# Altium integrated library CbyP.IntLib: 1144 symbols (part 2 of 6)
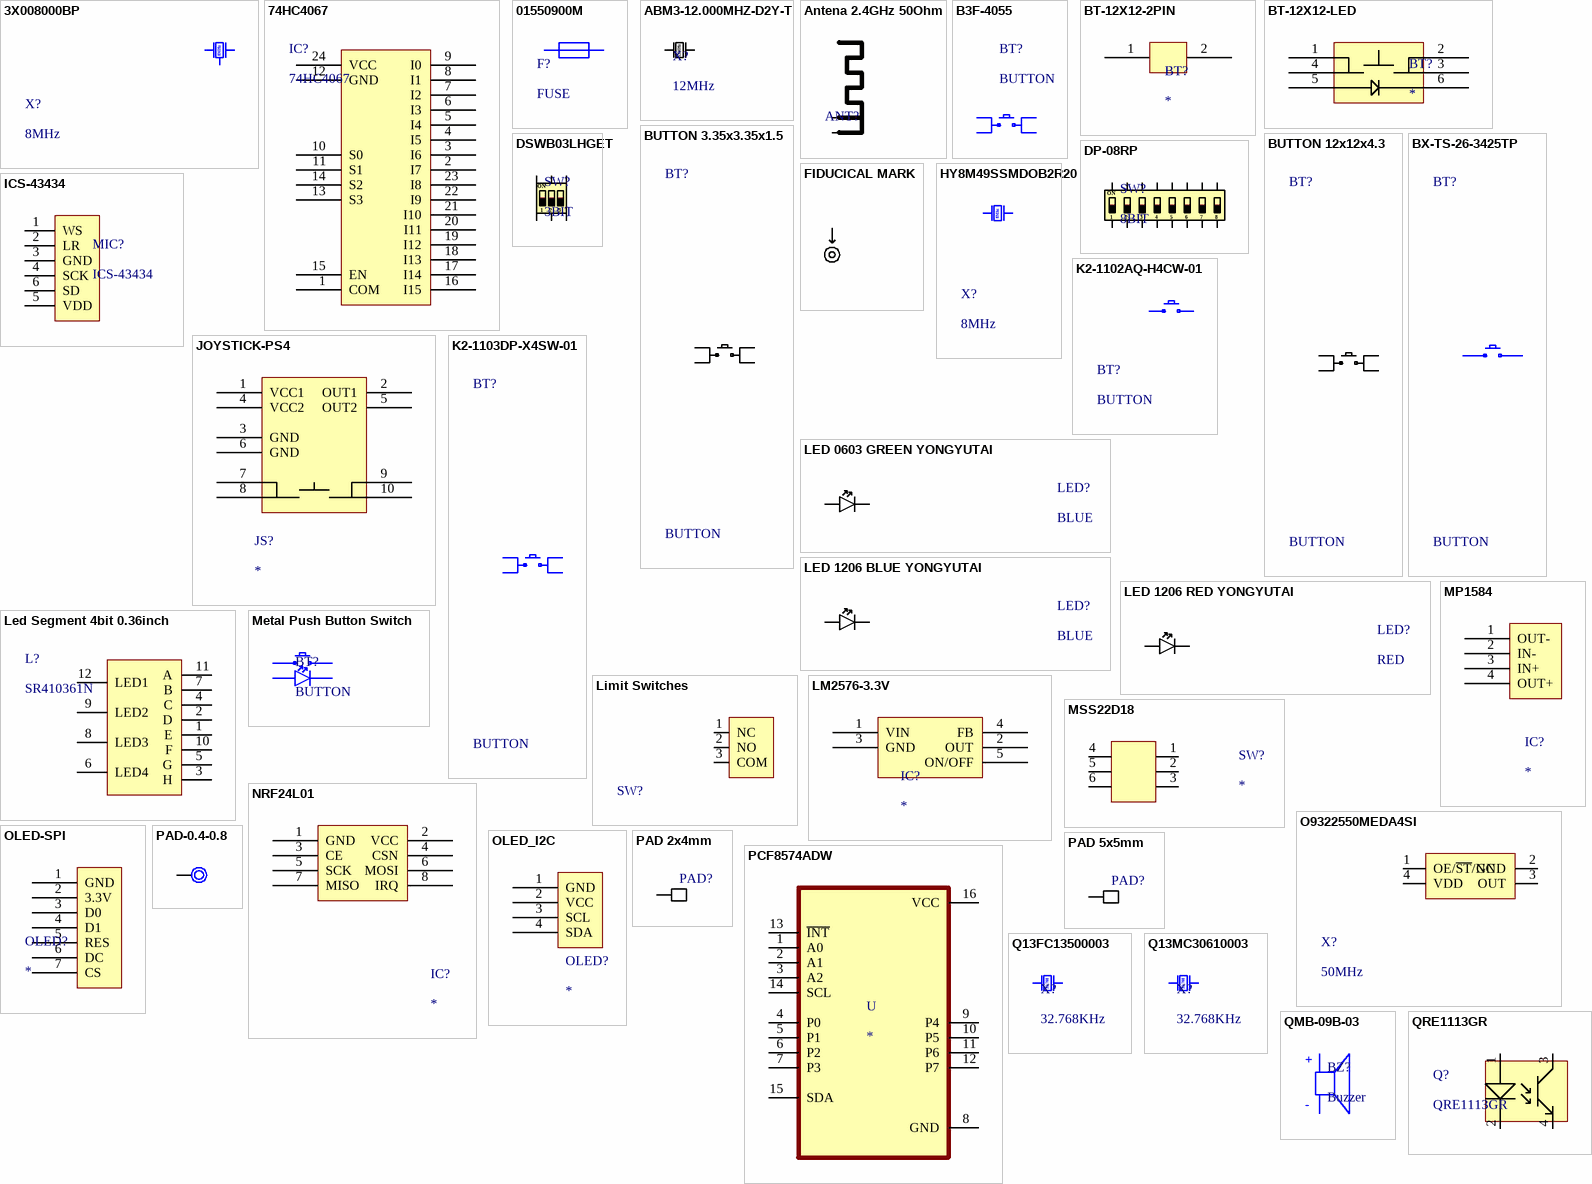
[diagram p42: symbols 3X008000BP to QRE1113GR]

## LED 1206 RED YONGYUTAI
designator LED?, comment RED
1206 LED Indication - Discrete ROHS; Manufacturer: YONGYUTAI; Mfr.Part #: YLED1206R; So_Chan_Cam: 0; So_Chan_Dan: 2; Name: LED 1206 RED YONGYUTAI; Package: 1206
footprint LED-RED-1206
pins: 1 A, 2 K

## Led Segment 4bit 0.36inch
designator L?, comment SR410361N
Red 4Bit Common anode 0.36 Plugin Led Segment Display ROHS
footprint LED_7_THANH_4_SO_0.36_INCH
pins: 1 E, 2 D, 3 H, 4 C, 5 G, 6 LED4, 7 B, 8 LED3, 9 LED2, 10 F, 11 A, 12 LED1

## Limit Switches
designator SW?  (value not drawn)
1A 30V Single Pole Double Throw (SPDT) Micro switch 1,000,000 Times Plugin Limit Switches ROHS; Manufacturer: XKB Connection; Mfr.Part #: DM1-150D-1; So_Chan_Dan: 0; So_Chan_Cam: 3; Package: Plugin; Name: Limit Switches
footprint Plugin, P=5.08
pins: 1 NC, 2 NO, 3 COM

## LM2576-3.3V
designator IC?
footprint TO220-5PIN
pins: 1 VIN, 2 OUT, 3 GND, 4 FB, 5 ON/OFF

## Metal Push Button Switch
designator BT?, comment BUTTON
ComponentLink1Description: Link
footprint Metal Push Button Switch
pins: 1, 2, 3, 4

## MP1584
designator IC?
footprint MP1584
pins: 1 OUT-, 2 IN-, 3 IN+, 4 OUT+

## MSS22D18
designator SW?
SMD
footprint MSS22D18 SMD
pins: 1 77, 2 78, 3 79, 4, 5 81, 6 82

## NRF24L01
designator IC?
footprint NRF24L01
pins: 1 GND, 2 VCC, 3 CE, 4 CSN, 5 SCK, 6 MOSI, 7 MISO, 8 IRQ

## O9322550MEDA4SI
designator X?, comment 50MHz
3.3V CMOS ±30ppm 50MHz SMD3225-4P Oscillators RoHS; Manufacturer: YXC Crystal Oscillators; Mfr.Part #: O9322550MEDA4SI; Package: SMD3225-4P; LCSC Part #: C496690; DigiKey Part Number: NO
footprint SMD3225-4P
pins: 1 OE/~{ST}/NC, 2 GND, 3 OUT, 4 VDD

## OLED-SPI
designator OLED?
footprint OLED-SPI-2
pins: 1 GND, 2 3.3V, 3 D0, 4 D1, 5 RES, 6 DC, 7 CS

## OLED_I2C
designator OLED?
0.96
footprint OLED_I2C_0.96
pins: 1 GND, 2 VCC, 3 SCL, 4 SDA

## PAD 2x4mm
designator PAD?  (value not drawn)
footprint PAD, 2x4mm
pins: 1

## PAD 5x5mm
designator PAD?, comment PAD 2x4mm  (value not drawn)
footprint PAD, 2x4mm
pins: 1

## PAD-0.4-0.8
designator ?
footprint PAD,0.4,0.8
pins: 0

## PCF8574ADW
designator U
Remote 8-Bit I/O Expander for I2C-Bus 16-SOIC -40 to 85; MF: Texas Instruments; MP: PCF8574ADW; Mouser-Purchase-URL: https://snapeda.com/shop?store=Mouser&id=554599; SnapEDA_Link: https://www.snapeda.com/parts/PCF8574ADW/Texas%20Instruments/view-part/554599/?ref=snap; DigiKey-Purchase-URL: https://snapeda.com/shop?store=DigiKey&id=554599; Package: SOIC-16 Texas Instruments; Price: None; Availability: Warning; Texas_Instruments-Purchase-URL: https://snapeda.com/shop?store=Texas+Instruments&id=554599; Value: *
footprint SO16W
pins: 1 A0, 2 A1, 3 A2, 4 P0, 5 P1, 6 P2, 7 P3, 8 GND (power), 9 P4, 10 P5, 11 P6, 12 P7, 13 ~{INT}, 14 SCL, 15 SDA, 16 VCC (power)

## Q13FC13500003
designator X?, comment 32.768KHz
CRYSTAL 32.768kHz 9pF SMD; Manufacturer: EPSON; Mfr.Part #: Q13FC13500003; Package: SMD3215; LCSC Part #: C99010
footprint SMD3215
pins: 1, 2
text: 32.768

## Q13MC30610003
designator X?, comment 32.768KHz
Crystal 32.768kHz ±20ppm 12.5pF 35kΩ MC-306; Manufacturer: EPSON; Mfr.Part #: Q13MC30610003; Package: MC-306; LCSC Part #: C16320; DigiKey Part Number: SER2407TR-ND
footprint MC-306
pins: 1, 4
text: 32.768

## QMB-09B-03
designator BZ?, comment Buzzer
Buzzers Passive (Externally Driven) Magnetic 2V~5V 2.7kHz 85dB Through Hole,D=9mm; Manufacturer: Huaneng; Mfr.Part #: QMB-09B-03; Package: Through Hole,D=9mm; LCSC Part #: C96256
footprint Plugin,D=9mm
pins: 1, 2
text: +; -

## QRE1113GR
designator Q?
20mA 1mm SMD-4P Reflective Optical Interrupters ROHS; Manufacturer: onsemi; So_Chan_Dan: 4; So_Chan_Cam: 0; Mfr.Part #: QRE1113GR; Package: SMD-4P; Name: QRE1113GR
footprint SMD-4P
pins: 1, 2, 3, 4

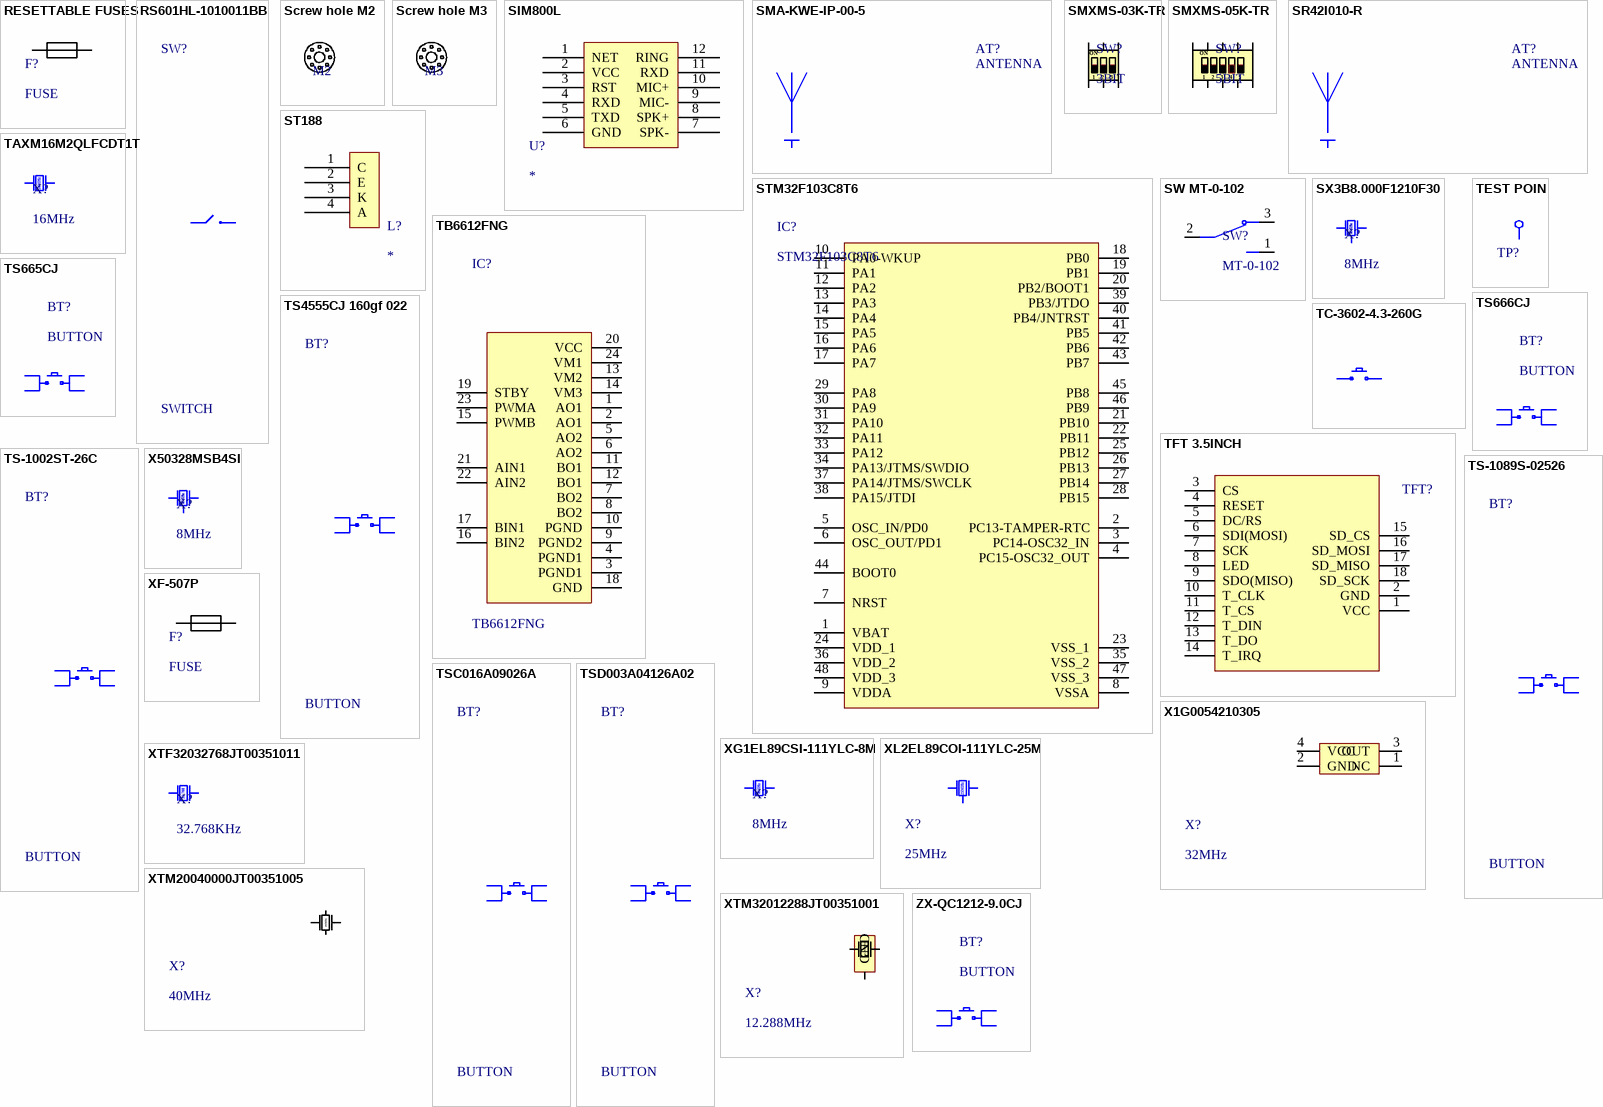
[diagram p6: symbols RESETTABLE FUSES to ZX-QC1212-9.0CJ]

## RESETTABLE FUSES
designator F?, comment FUSE
60V 500mA 40A 1A Plugin Resettable Fuses ROHS; Manufacturer: RUILON(Shenzhen Ruilongyuan Elec); Mfr.Part #: RL60-050; So_Chan_Dan: 0; So_Chan_Cam: 2; Package: Plugin; Name: RESETTABLE FUSES
footprint Plugin
pins: 1, 2

## RS601HL-1010011BB
designator SW?, comment SWITCH
SPST 10,000 times 3A Solder 250V None Plugin Rocker Switches ROHS; Manufacturer: HCTL; Mfr.Part #: RS601HL-1010011BB; Package: Through Hole,15x10.5mm; LCSC Part #: C2885782; DigiKey Part Number: NO
footprint Plugin,Rocker Switches
pins: 1, 2

## Screw hole M2
designator S?, comment M2
footprint Screw hole M2

## Screw hole M3
designator ?, comment M3
footprint Screw hole M3

## SIM800L
designator U?
footprint SIM800L
pins: 1 NET "50", 2 VCC, 3 RST, 4 RXD, 5 TXD, 6 GND, 7 SPK-, 8 SPK+, 9 MIC-, 10 MIC+, 11 RXD, 12 RING "50"

## SMA-KWE-IP-00-5
designator AT?, comment ANTENNA
SMA to IPEX Gen 1 Coaxial Cables (RF) Assemblies RoHS; Manufacturer: SAMZO; Mfr.Part #: SMA-KWE-IP-00-5; Package: Through Hole, Right Angle; LCSC Part #: C47121936; DigiKey Part Number: NO; ComponentLink1Description: Link; ComponentLink1URL: https://www.lcsc.com/product-detail/C47121936.html; ComponentLink2Description: Link 1
footprint ANTENNA, Through Hole, Right Angle
pins: 1 GND

## SMXMS-03K-TR
designator SW?, comment 3BIT
3 24V Black 25mA SMD-6P,5.4x5.4mm DIP Switches ROHS; Manufacturer: SM Switch; Mfr.Part #: SMXMS-03K-TR; Package: SMD-6P,5.4x5.4mm; LCSC Part #: C19272175
footprint SMD-6P,5.4x5.4mm
pins: 1, 2, 3, 4, 5, 6
text: ON

## SMXMS-05K-TR
designator SW?, comment 5BIT
5 Digits 24V Black 25mA SMD-10P,7.9x5.4mm DIP Switches ROHS; Manufacturer: SM Switch; Mfr.Part #: SMXMS-05K-TR; So_Chan_Dan: 5; So_Chan_Cam: 0; Package: SMD-10P,7.9x5.4mm; Name: SMXMS-05K-TR
footprint SMD-10P,7.9x5.4mm
pins: 1, 2, 3, 4, 5, 6, 7, 8, 9, 10
text: ON

## SR42I010-R
designator AT?, comment ANTENNA
Patch Antenna SMD-9P,12x11mm RF Antennas RoHS; Manufacturer: Antenova; Mfr.Part #: SR42I010-R; Package: SMD-9P,12x11mm; LCSC Part #: C3285093; DigiKey Part Number: 627-SR42I010-RTR-ND; ComponentLink1Description: Link; ComponentLink1URL: https://www.lcsc.com/product-detail/C3285093.html?s_z=n_q_C3285093&globalKeyword=C3285093; ComponentLink2Description: Link 1; ComponentLink2URL: https://www.digikey.com/en/products/detail/antenova/SR42I010-R/13980932?s=N4IgTCBcDaIMoCUAsYCSAGAjOgtAkAugL5A
footprint SR42I010-R
pins: 1 B.Sel, 2 Feed

## ST188
designator L?
footprint ST188
pins: 1 C, 2 E, 3 K, 4 A

## STM32F103C8T6
designator IC?
ARM Cortex-M3 32 Bit 72MHz 37 LQFP-48(7x7) Microcontrollers RoHS; Manufacturer: ST; Mfr.Part #: STM32F103C8T6; Package: LQFP-48(7x7); LCSC Part #: C8734; DigiKey Part Number: 497-6063-ND; ComponentLink1Description: Link; ComponentLink1URL: https://www.lcsc.com/product-detail/C8734.html?s_z=n_STM32F103C8T6; ComponentLink2Description: Link 1; ComponentLink2URL: https://www.digikey.com/en/products/detail/stmicroelectronics/STM32F103C8T6/1646338
footprint LQFP-48(7x7)
pins: 1 VBAT, 2 PC13-TAMPER-RTC, 3 PC14-OSC32_IN, 4 PC15-OSC32_OUT, 5 OSC_IN/PD0, 6 OSC_OUT/PD1, 7 NRST, 8 VSSA, 9 VDDA, 10 PA0-WKUP, 11 PA1, 12 PA2, 13 PA3, 14 PA4, 15 PA5, 16 PA6, 17 PA7, 18 PB0, 19 PB1, 20 PB2/BOOT1, 21 PB10, 22 PB11, 23 VSS_1, 24 VDD_1, 25 PB12, 26 PB13, 27 PB14, 28 PB15, 29 PA8, 30 PA9, 31 PA10, 32 PA11, 33 PA12, 34 PA13/JTMS/SWDIO, 35 VSS_2, 36 VDD_2, 37 PA14/JTMS/SWCLK, 38 PA15/JTDI, 39 PB3/JTDO, 40 PB4/JNTRST, 41 PB5, 42 PB6, 43 PB7, 44 BOOT0, 45 PB8, 46 PB9, 47 VSS_3, 48 VDD_3

## SW MT-0-102
designator SW?, comment MT-0-102
125V SPDT Straight 5A Plugin Toggle Switches ROHS; Manufacturer: YUEN FUNG; Mfr.Part #: MT-0-102-A101-M200-RS; Name: SW MT-0-102; So_Chan_Cam: 3; So_Chan_Dan: 0; Package: Plugin
footprint SW, Plugin,3P
pins: 1, 2, 3

## SX3B8.000F1210F30
designator X?, comment 8MHz
8MHz Crystal Oscillator 12pF ±10ppm ±30ppm SMD3225-4P Crystals ROHS; Manufacturer: Shenzhen SCTF Elec; Mfr.Part #: SX3B8.000F1210F30; Package: SMD3225-4P; LCSC Part #: C2901645
footprint SMD3225-4P
pins: 1, 2 GND, 3, 4 GND

## TAXM16M2QLFCDT1T
designator X?, comment 16MHz
Crystal Oscillator 20pF SMD5032-2P Crystals RoHS; Manufacturer: Yajingxin; Mfr.Part #: TAXM16M2QLFCDT1T; Package: SMD5032-2P; LCSC Part #: C122519; DigiKey Part Number: NO
footprint SMD5032
pins: 1, 2

## TB6612FNG
designator IC?
1A Brush DC Motor 2.7V~5.5V Parallel SSOP-24 Motor Driver ICs ROHS; Manufacturer: TOSHIBA; Mfr.Part #: TB6612FNG,C,8,EL; Package: SSOP-24; LCSC Part #: C141517; DigiKey Part Number: TB6612FNGC8ELTR-ND
footprint SSOP-24
pins: 1 AO1, 2 AO1, 3 PGND1, 4 PGND1, 5 AO2, 6 AO2, 7 BO2, 8 BO2, 9 PGND2, 10 PGND, 11 BO1, 12 BO1, 13 VM2 (power), 14 VM3 (power), 15 PWMB, 16 BIN2, 17 BIN1, 18 GND, 19 STBY, 20 VCC (power), 21 AIN1, 22 AIN2, 23 PWMA, 24 VM1 (power)

## TC-3602-4.3-260G
designator BT?, comment BUTTON
SWITCH TACTILE SPST 260gf SMD; Manufacturer: HCTL; Mfr.Part #: TC-3602-4.3-260G; Package: SMD,6x3.5mm; LCSC Part #: C3012022
footprint BUTTON-6X3.5x4.3-2PIN
pins: 1, 2

## TEST POIN
designator TP?, comment TP  (value not drawn)
Test poin; Manufacturer: NO; Mfr.Part #: NO; Package: SMD,D=1mm; LCSC Part #: NO; DigiKey Part Number: NO
footprint TEST POIN D=12=mm
pins: 1

## TFT 3.5INCH
designator TFT?, comment RED  (value not drawn)
TFT 3.5INCH; So_Chan_Cam: 18; So_Chan_Dan: 0; Manufacturer: TFT 3.5INCH; Mfr.Part #: TFT 3.5INCH; Package: TFT 3.5INCH; Name: TFT 3.5INCH
footprint TFT 3.5INCH 1
pins: 1 VCC, 2 GND, 3 CS, 4 RESET, 5 DC/RS, 6 SDI(MOSI), 7 SCK, 8 LED, 9 SDO(MISO), 10 T_CLK, 11 T_CS, 12 T_DIN, 13 T_DO, 14 T_IRQ, 15 SD_CS, 16 SD_MOSI, 17 SD_MISO, 18 SD_SCK

## TS665CJ
designator BT?, comment BUTTON
Tactile Switch SPST 5mm 6mm x 6mm Through Hole; Manufacturer: SHOU HAN; Mfr.Part #: TS665CJ; LCSC Part #: C393938; Package: Through Hole-4P,6x6mm; DigiKey Part Number: NO; ComponentLink1Description: Link; ComponentLink1URL: https://www.lcsc.com/product-detail/C393938.html
footprint Through Hole-4P,6x6x5mm
pins: 1, 2, 3, 4

## TS666CJ
designator BT?, comment BUTTON
Tactile Switch SPST 250gf 6mm PC Pin 6mm x 6mm Through Hole; Manufacturer: SHOU HAN; Mfr.Part #: TS666CJ; LCSC Part #: C557621; Package: Through Hole-4P,6x6mm; DigiKey Part Number: NO; ComponentLink1Description: Link; ComponentLink1URL: https://www.lcsc.com/product-detail/C557621.html
footprint Through Hole-4P,6x6x6mm
pins: 1, 2, 3, 4

## TS4555CJ 160gf 022
designator BT?, comment BUTTON
Without Bracket 12V Round Button No SPST 50mA Through Hole-4P,4.5x4.5mm Tactile Switches ROHS; Manufacturer: SHOU HAN; Mfr.Part #: TS4555CJ 160gf 022; Package: Through Hole-4P,4.5x4.5mm; LCSC Part #: C5369124; DigiKey Part Number: NO
footprint Plugin, Button 4.5x4.5mm
pins: 1, 2, 3, 4

## TS-1002ST-26C
designator BT?, comment BUTTON
Tactile Switch SPST 7.3mm 6mm x 6mm Surface Mount; Manufacturer: XUNPU; Mfr.Part #: TS-1002ST-26C; Package: SMD-4P,6x6mm; LCSC Part #: C455199; DigiKey Part Number: NO
footprint BUTTON-6x6x7.3-4PIN-SQUARE
pins: 1, 2, 3, 4

## TS-1089S-02526
designator BT?, comment BUTTON
3.25mm 2.5mm Oval button 50mA Standing paste 4.2mm SPST 12V SMD,3.3x4.2mm Tactile Switches ROHS; Manufacturer: XUNPU; Mfr.Part #: TS-1089S-02526; Package: SMD,3.3x4.2mm; LCSC Part #: C455282; DigiKey Part Number: NO
footprint SMD,3.3x4.2mm
pins: 1, 2, 3, 4

## TSC016A09026A
designator BT?, comment BUTTON
4.5mm 9mm 50mA Round Button Straight 4.5mm 2.6N 12V Plugin Tactile Switches ROHS; Manufacturer: BZCN; Mfr.Part #: TSC016A09026A; Package: Through Hole-4P,4.5x4.5mm; LCSC Part #: C2888899
footprint Plugin, Button 4.5x4.5mm
pins: 1, 2, 3, 4

## TSD003A04126A02
designator BT?, comment BUTTON
Tactile Switch 260gf 4.1mm 6mm x 6mm Surface Mount; Manufacturer: BZCN; Mfr.Part #: TSD003A04126A02; Package: SMD-4P,6x6mm; ComponentLink1Description: Link; ComponentLink1URL: https://www.lcsc.com/product-detail/C2888573.html?s_z=n_TSD003A04126A02&spm=wm.ssy.bg.0.xh&lcsc_vid=QVhYA1deElkMBVEAQVVWVAECEVVXUAcCTgNYUQVSEVAxVlNRQVBcXlxUT1NdUjsOAxUeFF5JWBYZEEoKFBINSQcJGk4eFQsCAgIaSgADAwAHC0slRlleUFNRQlhADxALGw%3D%3D; ComponentLink2Description: Link 1; LCSC Part #: C2888573; DigiKey Part Number: NO
footprint BUTTON-6x6x4.1-4PIN
pins: 1, 2, 3, 4

## X1G0054210305
designator X?, comment 32MHz
Temperature Compensated Crystal Oscillator (TCXO); Manufacturer: EPSON; Mfr.Part #: X1G0054210305; Package: SMD2520-4P; LCSC Part #: C3007516
footprint SMD2520-4P
pins: 1 NC, 2 GND, 3 OUT, 4 VCC

## X50328MSB4SI
designator X?, comment 8MHz
Crystal 8MHz ±10ppm 20pF SMD5032-4P; Manufacturer: YXC Crystal Oscillators; Mfr.Part #: X50328MSB4SI; Package: SMD5032-4P; LCSC Part #: C157341; DigiKey Part Number: NO; ComponentLink1Description: Link; ComponentLink1URL: https://www.lcsc.com/product-detail/C157341.html?s_z=n_c157341; ComponentLink2Description: Link 1
footprint SMD5032-4P
pins: 1, 2 GND, 3, 4 GND

## XF-507P
designator F?, comment FUSE
Fuseholders ROHS; Manufacturer: XFCN; Mfr.Part #: XF-507P; Package: Plugin
footprint XF-507P
pins: 1, 2

## XG1EL89CSI-111YLC-8M
designator X?, comment 8MHz
Crystal 8MHz ±10ppm 20pF SMD5032-2P; Manufacturer: YXC Crystal Oscillators; Mfr.Part #: XG1EL89CSI-111YLC-8M; Package: SMD5032-2P; LCSC Part #: C5280575; DigiKey Part Number: NO; ComponentLink1Description: Link; ComponentLink1URL: https://www.lcsc.com/product-detail/C5280575.html
footprint SMD5032
pins: 1, 2

## XL2EL89COI-111YLC-25M
designator X?, comment 25MHz
Crystal 25MHz ±10ppm 12pF SMD3225-4P; Manufacturer: YXC Crystal Oscillators; Mfr.Part #: XL2EL89COI-111YLC-25M; Package: SMD3225-4P; LCSC Part #: C5444544; DigiKey Part Number: NO
footprint SMD3225-4P
pins: 1, 2 GND, 3, 4 GND

## XTF32032768JT00351011
designator X?, comment 32.768KHz
Crystal Oscillator 12pF SMD3215-2P Crystals RoHS; Manufacturer: TOGNJING; Mfr.Part #: XTF32032768JT00351011; Package: SMD3215; LCSC Part #: C37635363; DigiKey Part Number: NO
footprint SMD3215
pins: 1, 2
text: 32.768

## XTM20040000JT00351005
designator X?, comment 40MHz
40MHz Surface Mount Crystal 12pF ±10ppm ±20ppm SMD2016-4P Crystals ROHS; Manufacturer: TOGNJING; Mfr.Part #: XTM20040000JT00351005; So_Chan_Dan: 4; So_Chan_Cam: 0; Package: SMD2016-4P; Name: XTM20040000JT00351005
footprint SMD2016-4P
pins: 1, 2 GND, 3, 4 GND

## XTM32012288JT00351001
designator X?, comment 12.288MHz
12.288MHz Crystal Oscillator 12pF ±10ppm ±10ppm SMD3225-4P Crystals ROHS; Manufacturer: TOGNJING; Mfr.Part #: XTM32012288JT00351001; Package: SMD3225-4P; LCSC Part #: C41383238; ComponentLink1Description: Link; ComponentLink1URL: https://www.lcsc.com/product-detail/C41383238.html?s_z=n_XTM32012288JT00351001; ComponentLink2Description: Link 1; DigiKey Part Number: NO
footprint SMD3225-4P
pins: 1, 2 GND, 3, 4 GND

## ZX-QC1212-9.0CJ
designator BT?, comment BUTTON
Without Bracket 12mm 12V 12mm Round Button SPST 50mA Through Hole,12x12mm Tactile Switches RoHS; Manufacturer: Megastar; Mfr.Part #: ZX-QC1212-9.0CJ; LCSC Part #: C7470193; Package: Through Hole,12x12mm; DigiKey Part Number: NO
footprint BUTTON-12x12x9mm
pins: 1, 2, 3, 4


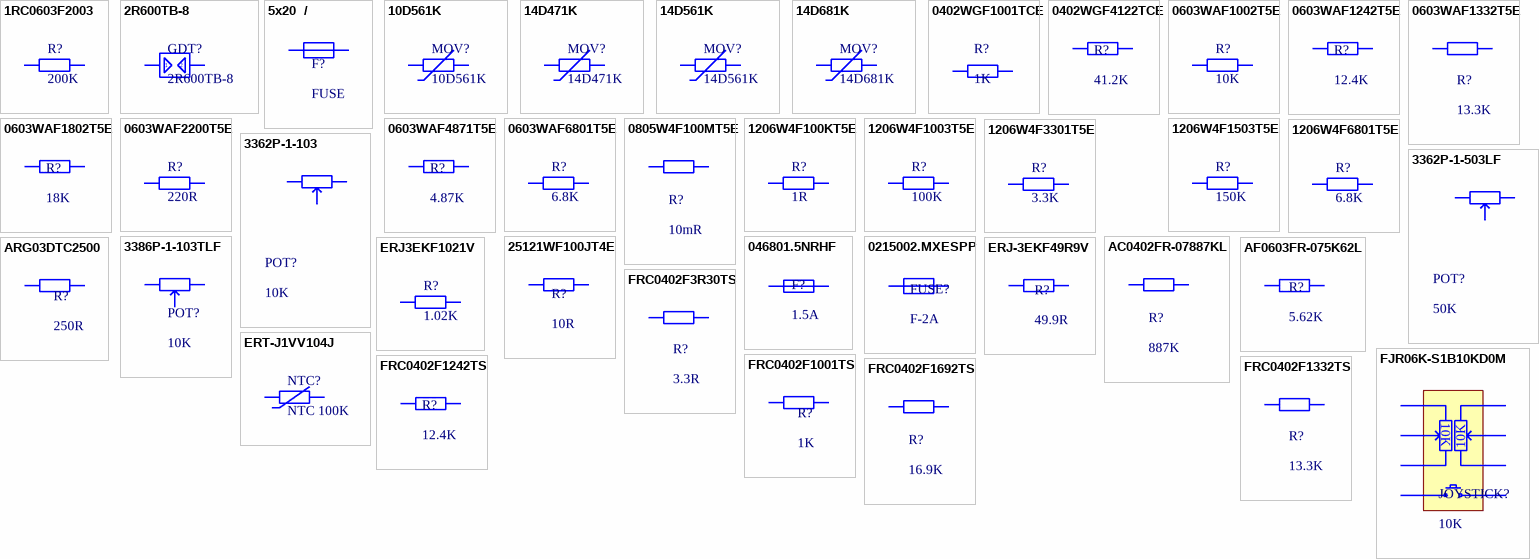
[diagram p7: symbols 1RC0603F2003 to FRC0402F1692TS]

## 1RC0603F2003
designator R?, comment 200K
100mW 200kΩ 75V Thick Film Resistor ±100ppm/℃ ±1% 0603 Chip Resistor - Surface Mount RoHS; Manufacturer: SAE; Mfr.Part #: 1RC0603F2003; Package: 0603; LCSC Part #: C53224194
footprint RES-0603
pins: 1, 2

## 2R600TB-8
designator GDT?
GDT 600V 10kA 2 POLE TH; Manufacturer: RUILON; Mfr.Part #: 2R600TB-8; Package: Through Hole,D8xL6mm; LCSC Part #: C2686911
footprint Through Hole,P=12.5mm,8x6x8mm
pins: 1, 2

## 5x20  /
designator F?, comment FUSE
Cylindrical Clip Through Hole,P=4.8mm Fuseholders RoHS; Manufacturer: Xucheng Elec; Mfr.Part #: 5x20  /; Package: Through Hole,P=4.8mm; LCSC Part #: C3130; DigiKey Part Number: NO; ComponentLink1Description: Link; ComponentLink1URL: https://www.lcsc.com/product-detail/C3130.html
footprint Through Hole,P=4.8mm
pins: 1, 2

## 10D561K
designator MOV?
920V 460V 350V 504V~616V Through Hole,P=7.5mm Varistors, MOVs RoHS; Manufacturer: RUILON; Mfr.Part #: 10D561K; Package: Through Hole,P=7.5mm; LCSC Part #: C233178; DigiKey Part Number: 5789-10D561K-ND
footprint Through Hole,P=7.5mm
pins: 1, 2

## 14D471K
designator MOV?
VARISTOR 470V 4500A P=7.5mm; Manufacturer: R+O; Mfr.Part #: 14D471K; Package: Through Hole,P=7.5mm; LCSC Part #: C49069733
footprint Through Hole,P=7.5mm,14x6x14mm
pins: 1, 2

## 14D561K
designator MOV?
925V 460V 350V 504V~616V Through Hole,P=7.5mm Varistors, MOVs RoHS; Manufacturer: R+O; Mfr.Part #: 14D561K; Package: Through Hole,P=7.5mm; LCSC Part #: C49069734
footprint Through Hole,P=7.5mm,14x6x14mm
pins: 1, 2

## 14D681K
designator MOV?
1.12kV 560V 420V 612V~748V Through Hole,P=7.5mm Varistors, MOVs RoHS; Manufacturer: R+O; Mfr.Part #: 14D681K; Package: Through Hole,P=7.5mm; LCSC Part #: C49069736
footprint Through Hole,P=7.5mm,14x6x14mm
pins: 1, 2

## 0402WGF1001TCE
designator R?, comment 1K
62.5mW Thick Film Resistor 50V ±100ppm/℃ ±1% 1kΩ 0402 Chip Resistor - Surface Mount ROHS; Manufacturer: UNI-ROYAL(Uniroyal Elec); Mfr.Part #: 0402WGF1001TCE; Package: 0402; LCSC Part #: C11702; DigiKey Part Number: NO
footprint RES-0402
pins: 1, 2

## 0402WGF4122TCE
designator R?, comment 41.2K
41.2kΩ ±1% 62.5mW 0402 Thick Film Resistor; Manufacturer: UNI-ROYAL; Mfr.Part #: 0402WGF4122TCE; Package: 0402; LCSC Part #: C26978; DigiKey Part Number: NO; ComponentLink1Description: Link; ComponentLink1URL: https://www.lcsc.com/product-detail/C26978.html; ComponentLink2Description: Link 1
footprint RES-0402
pins: 1, 2

## 0603WAF1002T5E
designator R?, comment 10K
10kΩ ±1% 100mW 0603 Thick Film Resistor; Manufacturer: UNI-ROYAL; Mfr.Part #: 0603WAF1002T5E; Package: 0603; LCSC Part #: C25804; DigiKey Part Number: NO; ComponentLink1Description: Link; ComponentLink1URL: https://www.lcsc.com/product-detail/C25804.html?s_z=n_0603WAF1002T5E; ComponentLink2Description: Link 1
footprint RES-0603
pins: 1, 2

## 0603WAF1242T5E
designator R?, comment 12.4K
12.4kΩ ±1% 100mW 0603 Thick Film Resistor; Manufacturer: UNI-ROYAL; Mfr.Part #: 0603WAF1242T5E; Package: 0603; LCSC Part #: C22865; DigiKey Part Number: NO; ComponentLink1Description: Link; ComponentLink1URL: https://www.lcsc.com/product-detail/C22865.html?s_z=n_q_t_12.4K&spm=wm.fly.bg.7.xh___wm.ssy.tc.0.tz&lcsc_vid=QwdcUVxUFAdbVwUFRQBWBVECTlNYX1QAQFddU1EFQ1kxVlNRT1RXUFZXT1BdXzsOAxUeFF5JWBYZEEoKFBINSQcJGk4eFQsCAgIaSgADAwAHC0slRlleUFNRQlhADxALGw%3D%3D; ComponentLink2Description: Link 1
footprint RES-0603
pins: 1, 2

## 0603WAF1332T5E
designator R?, comment 13.3K
100mW 13.3kΩ 75V ±100ppm/℃ Thick Film Resistor ±1% 0603 Chip Resistor - Surface Mount ROHS; Manufacturer: UNI-ROYAL; Mfr.Part #: 0603WAF1332T5E; Package: 0603; LCSC Part #: C25952
footprint RES-0603
pins: 1, 2

## 0603WAF1802T5E
designator R?, comment 18K
18kΩ ±1% 100mW 0603 Thick Film Resistor; Manufacturer: UNI-ROYAL; Mfr.Part #: 0603WAF1802T5E; Package: 0603; LCSC Part #: C25810; DigiKey Part Number: NO; ComponentLink1Description: Link; ComponentLink1URL: https://www.lcsc.com/product-detail/C25810.html?s_z=n_18K; ComponentLink2Description: Link 1
footprint RES-0603
footprint RES-0603-1
pins: 1, 2

## 0603WAF2200T5E
designator R?, comment 220R
220Ω ±1% 100mW 0603 Thick Film Resistor; Manufacturer: UNI-ROYAL; Mfr.Part #: 0603WAF2200T5E; Package: 0603; LCSC Part #: C22962; DigiKey Part Number: NO; ComponentLink1Description: Link; ComponentLink1URL: https://www.lcsc.com/product-detail/C22962.html?s_z=n_0603waf22; ComponentLink2Description: Link 1
footprint RES-0603
pins: 1, 2

## 0603WAF4871T5E
designator R?, comment 4.87K
4.87kΩ ±1% 100mW 0603 Thick Film Resistor; Manufacturer: UNI-ROYAL; Mfr.Part #: 0603WAF4871T5E; Package: 0603; LCSC Part #: C23045; DigiKey Part Number: NO; ComponentLink1Description: Link; ComponentLink1URL: https://www.lcsc.com/product-detail/C23045.html?s_z=n_4.87K; ComponentLink2Description: Link 1
footprint RES-0603
pins: 1, 2

## 0603WAF6801T5E
designator R?, comment 6.8K
6.8kΩ ±1% 100mW 0603 Thick Film Resistor; Manufacturer: UNI-ROYAL; Mfr.Part #: 0603WAF6801T5E; Package: 0603; LCSC Part #: C23212; DigiKey Part Number: NO; ComponentLink1Description: Link; ComponentLink1URL: https://www.lcsc.com/product-detail/C23212.html?s_z=n_C23212; ComponentLink2Description: Link 1
footprint RES-0603
pins: 1, 2

## 0805W4F100MT5E
designator R?, comment 10mR
RES 10mΩ ±1% 250mW 0805; Manufacturer: UNI-ROYAL; Mfr.Part #: 0805W4F100MT5E; Package: 0805; LCSC Part #: C270927
footprint RES-0805-1
footprint RES-0805
pins: 1, 2

## 1206W4F100KT5E
designator R?, comment 1R
1Ω ±1% 250mW 1206 Thick Film Resistor; Manufacturer: UNI-ROYAL; Mfr.Part #: 1206W4F100KT5E; LCSC Part #: C17928; Package: 1206; DigiKey Part Number: NO; ComponentLink1Description: Link; ComponentLink1URL: https://www.lcsc.com/product-detail/C17928.html; ComponentLink2Description: Link 1
footprint RES-1206
pins: 1, 2

## 1206W4F1003T5E
designator R?, comment 100K
RES 100kΩ ±1% 250mW 1206; Manufacturer: UNI-ROYAL; Mfr.Part #: 1206W4F1003T5E; LCSC Part #: C17900; Package: 1206
footprint RES-1206
pins: 1, 2

## 1206W4F1503T5E
designator R?, comment 150K
150kΩ ±1% 250mW 1206 Thick Film Resistor; Manufacturer: UNI-ROYAL; Mfr.Part #: 1206W4F1503T5E; LCSC Part #: C17916; Package: 1206; DigiKey Part Number: NO; ComponentLink1Description: Link; ComponentLink1URL: https://www.lcsc.com/product-detail/C17916.html; ComponentLink2Description: Link 1
footprint RES-1206
pins: 1, 2

## 1206W4F3301T5E
designator R?, comment 3.3K
3.3kΩ ±1% 250mW 1206 Thick Film Resistor; Manufacturer: UNI-ROYAL; Mfr.Part #: 1206W4F3301T5E; LCSC Part #: C26032; Package: 1206; DigiKey Part Number: NO; ComponentLink1Description: Link; ComponentLink1URL: https://www.lcsc.com/product-detail/C26032.html; ComponentLink2Description: Link 1
footprint RES-1206
pins: 1, 2

## 1206W4F6801T5E
designator R?, comment 6.8K
6.8kΩ ±1% 250mW 1206 Thick Film Resistor; Manufacturer: UNI-ROYAL; Mfr.Part #: 1206W4F6801T5E; LCSC Part #: C26034; Package: 1206; DigiKey Part Number: NO; ComponentLink1Description: Link; ComponentLink1URL: https://www.lcsc.com/product-detail/C26034.html; ComponentLink2Description: Link 1
footprint RES-1206
pins: 1, 2

## 3362P-1-103
designator POT?, comment 10K
±10% 500mW 10kΩ Through Hole Trimmer Potentiometers RoHS; Mfr.Part #: 3362P-1-103; Manufacturer: BOCHEN; Package: Through Hole; LCSC Part #: C118956
footprint Through Hole-3P,7x6.6mm
pins: 1, 2, 3

## 3362P-1-503LF
designator POT?, comment 50K
±10%  50kΩ Through Hole Carbon Film Potentiometer; Mfr.Part #: 3362P-1-503LF; Manufacturer: BOURNS; Package: Through Hole-3P,7x6.6mm; LCSC Part #: C81264; DigiKey Part Number: 3362P-503LF-ND; ComponentLink1Description: Link; ComponentLink1URL: https://www.lcsc.com/product-detail/C81264.html; ComponentLink2Description: Link 1; ComponentLink2URL: https://www.digikey.com/en/products/detail/bourns-inc/3362P-1-503LF/1003342?s=N4IgTCBcDaIMxwGxgAoFoCMaCsAGOAMgGIgC6AvkA
footprint Through Hole-3P,7x6.6mm
pins: 1, 2, 3

## 3386P-1-103TLF
designator POT?, comment 10K
10kΩ ±10% 500mW Through Hole-3P,9.5x9.5mm Potentiometers, Variable Resistors; Mfr.Part #: 3386P-1-103TLF; Manufacturer: BOURNS; RC1206FR-0710RL: 3386P-103TLF-ND; Package: Through Hole-3P,9.5x9.5mm; LCSC Part #: C116302
footprint 3386P
pins: 1, 2, 3

## 25121WF100JT4E
designator R?, comment 10R
1W Thick Film Resistor 200V ±1% ±400ppm/℃ 10Ω 2512 Chip Resistor - Surface Mount ROHS; Manufacturer: UNI-ROYAL; Mfr.Part #: 25121WF100JT4E; Package: 2512; LCSC Part #: C47019
footprint RES-2512
pins: 1, 2

## 046801.5NRHF
designator F?, comment 1.5A
Surface Mount Fuse 1.5A 1206 Fuses RoHS; Manufacturer: Littelfuse; Mfr.Part #: 046801.5NRHF; Package: 1206; LCSC Part #: 046801.5NRHF; DigiKey Part Number: F6023TR-ND
footprint FUSE-1206
pins: 1, 2

## 0215002.MXESPP
designator FUSE?, comment F-2A
FUSE BRD MNT 2A 250VAC/VDC TH; Manufacturer: Littelfuse; Mfr.Part #: 0215002.MXESPP; LCSC Part #: C178839; Package: Through Hole,D5.2xL20mm
footprint Through Hole,P=5mm,20x5.2mm
pins: 1, 2

## AC0402FR-07887KL
designator R?, comment 887K
887kΩ 62.5mW 50V Thick Film Resistor ±100ppm/℃ ±1% 0402 Chip Resistor - Surface Mount RoHS; Manufacturer: YAGEO; Mfr.Part #: AC0402FR-07887KL; Package: 0402; LCSC Part #: C227254; DigiKey Part Number: 13-AC0402FR-07887KL-ND; ComponentLink1Description: Link; ComponentLink1URL: https://www.lcsc.com/product-detail/C227254.html; ComponentLink2Description: Link 1; ComponentLink2URL: https://www.digikey.com/en/products/detail/yageo/AC0402FR-07887KL/17009638?s=N4IgTCBcDaIIIGEAMAWJYBiAlAtEg7AByH4DSAMiALoC%2BQA
footprint RES-0402
pins: 1, 2

## AF0603FR-075K62L
designator R?, comment 5.62K
100mW Thick Film Resistors ±100ppm/℃ ±1% 5.62kΩ 0603 Chip Resistor - Surface Mount ROHS; Manufacturer: YAGEO; Mfr.Part #: AF0603FR-075K62L; Package: 0603; LCSC Part #: C4173499
footprint RES-0603
pins: 1, 2

## ARG03DTC2500
designator R?, comment 250R
100mW 250Ω 75V ±25ppm/℃ Thin Film Resistor ±0.5% 0603 Chip Resistor - Surface Mount RoHS; Manufacturer: Viking; Mfr.Part #: ARG03DTC2500; Package: 0603; LCSC Part #: C2828652; DigiKey Part Number: NO
footprint RES-0603
pins: 1, 2

## ERJ3EKF1021V
designator R?, comment 1.02K
100mW Thick Film Resistors ±100ppm/℃ ±1% 1.02kΩ 0603 Chip Resistor - Surface Mount ROHS; Manufacturer: PANASONIC; Mfr.Part #: ERJ3EKF1021V; Package: 0603; LCSC Part #: C402868
footprint RES-0603
pins: 1, 2

## ERJ-3EKF49R9V
designator R?, comment 49.9R
49.9 Ohms ±1% 0.1W, 1/10W Chip Resistor 0603 (1608 Metric) Automotive AEC-Q200 Thick Film; Manufacturer: Panasonic Electronic Components; Mfr.Part #: ERJ-3EKF49R9V; Package: 0603; DigiKey Part Number: P49.9HTR-ND; LCSC Part #: C403255
footprint RES-0603
pins: 1, 2

## ERT-J1VV104J
designator NTC?, comment NTC 100K
THERM NTC 100KOHM 4700K 0603; Mfr.Part #: ERT-J1VV104J; Manufacturer: Panasonic Electronic Components; Package: 0603; DigiKey Part Number: P10555TR-ND
footprint RES-0603
pins: 1, 2

## FJR06K-S1B10KD0M
designator JOYSTICK?, comment 10K
Axis Through Hole Joystick Potentiometer 46° 0.0125W; Mfr.Part #: FJR06K-S1B10KD0M; Manufacturer: Favor Electronics; Package: Through Hole; LCSC Part #: NO; DigiKey Part Number: 4434-FJR06K-S1B10KD0M-ND
footprint FJR06K-S1B10KD0M
pins: 1, 1', 2, 2', 3, 3', a, b

## FRC0402F3R30TS
designator R?, comment 3.3R
3.3Ω ±1% 62.5mW 0402 Thick Film Resistor; Manufacturer: FOJAN; Mfr.Part #: FRC0402F3R30TS; Package: 0402; LCSC Part #: C2933094
footprint RES-0402
pins: 1, 2

## FRC0402F1001TS
designator R?, comment 1K
RES 1kΩ ±1% 62.5mW 0402; Manufacturer: FOJAN; Mfr.Part #: FRC0402F1001TS; Package: 0402; LCSC Part #: C2906864
footprint RES-0402
pins: 1, 2

## FRC0402F1242TS
designator R?, comment 12.4K
RES 12.4kΩ ±1% 62.5mW 0402; Manufacturer: FOJAN; Mfr.Part #: FRC0402F1242TS; Package: 0402; LCSC Part #: C2929935
footprint RES-0402
pins: 1, 2

## FRC0402F1332TS
designator R?, comment 13.3K
13.3kΩ 62.5mW 50V ±100ppm/℃ Thick Film Resistor ±1% 0402 Chip Resistor - Surface Mount ROHS; Manufacturer: FOJAN; Mfr.Part #: FRC0402F1332TS; Package: 0402; LCSC Part #: C2974007
footprint RES-0402
pins: 1, 2

## FRC0402F1692TS
designator R?, comment 16.9K
RES 16.9kΩ ±1% 62.5mW 0402; Manufacturer: FOJAN; Mfr.Part #: FRC0402F1692TS; Package: 0402; LCSC Part #: C2929989
footprint RES-0402
pins: 1, 2

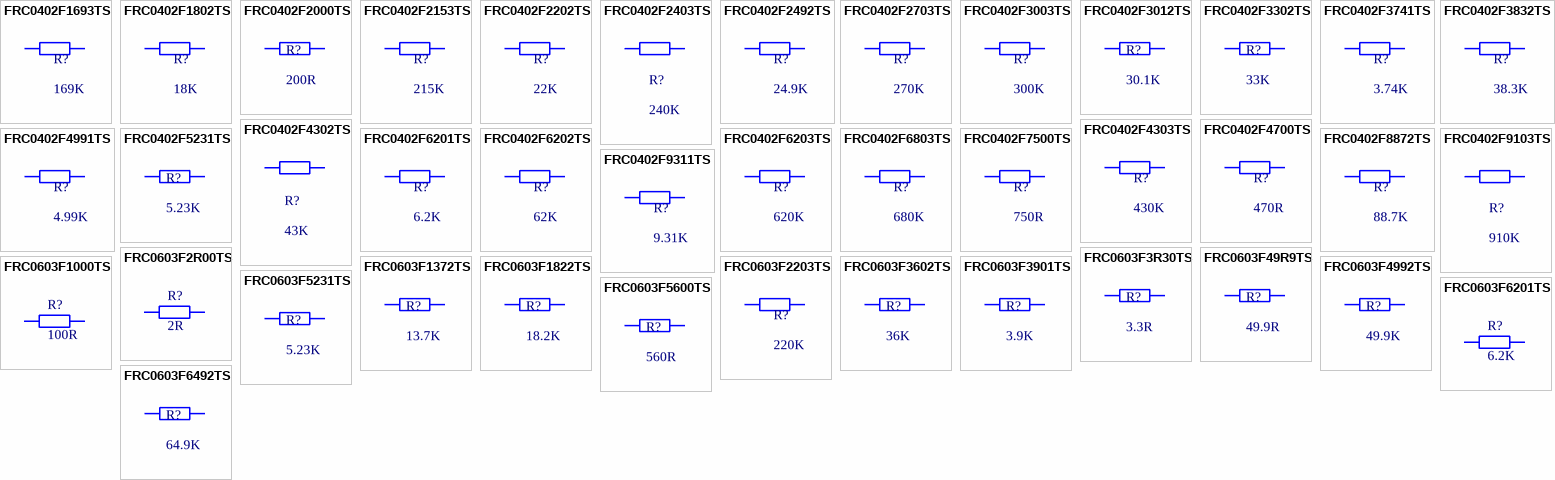
[diagram p8: symbols FRC0402F1693TS to FRC0603F6492TS]

## FRC0402F1693TS
designator R?, comment 169K
RES 169kΩ ±1% 62.5mW 0402; Manufacturer: FOJAN; Mfr.Part #: FRC0402F1693TS; Package: 0402; LCSC Part #: C2974012
footprint RES-0402
pins: 1, 2

## FRC0402F1802TS
designator R?, comment 18K
RES 18kΩ ±1% 62.5mW 0402; Manufacturer: FOJAN; Mfr.Part #: FRC0402F1802TS; Package: 0402; LCSC Part #: C2909327
footprint RES-0402
pins: 1, 2

## FRC0402F2000TS
designator R?, comment 200R
RES 200Ω ±1% 62.5mW 0402; Manufacturer: FOJAN; Mfr.Part #: FRC0402F2000TS; Package: 0402; LCSC Part #: C2909333
footprint RES-0402
pins: 1, 2

## FRC0402F2153TS
designator R?, comment 215K
RES 215kΩ ±1% 62.5mW 0402; Manufacturer: FOJAN; Mfr.Part #: FRC0402F2153TS; Package: 0402; LCSC Part #: C3013158
footprint RES-0402
pins: 1, 2

## FRC0402F2202TS
designator R?, comment 22K
RES 22kΩ ±1% 62.5mW 0402; Manufacturer: FOJAN; Mfr.Part #: FRC0402F2202TS; Package: 0402; LCSC Part #: C2909337
footprint RES-0402
pins: 1, 2

## FRC0402F2403TS
designator R?, comment 240K
240kΩ ±1% 62.5mW 0402 Thick Film Resistor; Manufacturer: FOJAN; Mfr.Part #: FRC0402F2403TS; Package: 0402; LCSC Part #: C2909338
footprint RES-0402
pins: 1, 2

## FRC0402F2492TS
designator R?, comment 24.9K
RES 24.9kΩ ±1% 62.5mW 0402; Manufacturer: FOJAN; Mfr.Part #: FRC0402F2492TS; Package: 0402; LCSC Part #: C2998048
footprint RES-0402
pins: 1, 2

## FRC0402F2703TS
designator R?, comment 270K
RES 270kΩ ±1% 62.5mW 0402; Manufacturer: FOJAN; Mfr.Part #: FRC0402F2703TS; Package: 0402; LCSC Part #: C2909341
footprint RES-0402
pins: 1, 2

## FRC0402F3003TS
designator R?, comment 300K
RES 300kΩ ±1% 62.5mW 0402; Manufacturer: FOJAN; Mfr.Part #: FRC0402F3003TS; Package: 0402; LCSC Part #: C2929999
footprint RES-0402
pins: 1, 2

## FRC0402F3012TS
designator R?, comment 30.1K
30.1kΩ ±1% 62.5mW 0402 Thick Film Resistor; Manufacturer: FOJAN; Mfr.Part #: FRC0402F3012TS; Package: 0402; LCSC Part #: C2998131; DigiKey Part Number: NO; ComponentLink1Description: Link; ComponentLink1URL: https://www.lcsc.com/product-detail/C2998131.html; ComponentLink2Description: Link 1
footprint RES-0402
pins: 1, 2

## FRC0402F3302TS
designator R?, comment 33K
RES 33kΩ ±1% 62.5mW 0402; Manufacturer: FOJAN; Mfr.Part #: FRC0402F3302TS; Package: 0402; LCSC Part #: C2909350
footprint RES-0402
pins: 1, 2

## FRC0402F3741TS
designator R?, comment 3.74K
RES 3.74kΩ ±1% 62.5mW 0402; Manufacturer: FOJAN; Mfr.Part #: FRC0402F3741TS; Package: 0402; LCSC Part #: C5154016
footprint RES-0402
pins: 1, 2

## FRC0402F3832TS
designator R?, comment 38.3K
RES 38.3kΩ ±1% 62.5mW 0402; Manufacturer: FOJAN; Mfr.Part #: FRC0402F3832TS; Package: 0402; LCSC Part #: C5126223
footprint RES-0402
pins: 1, 2

## FRC0402F4302TS
designator R?, comment 43K
RES 43kΩ ±1% 62.5mW 0402; Manufacturer: FOJAN; Mfr.Part #: FRC0402F4302TS; Package: 0402; LCSC Part #: C2909359
footprint RES-0402
pins: 1, 2

## FRC0402F4303TS
designator R?, comment 430K
RES 430kΩ ±1% 62.5mW 0402; Manufacturer: FOJAN; Mfr.Part #: FRC0402F4303TS; Package: 0402; LCSC Part #: C2909357
footprint RES-0402
pins: 1, 2

## FRC0402F4700TS
designator R?, comment 470R
RES 470Ω ±1% 62.5mW 0402; Manufacturer: FOJAN; Mfr.Part #: FRC0402F4700TS; Package: 0402; LCSC Part #: C2909361
footprint RES-0402
pins: 1, 2

## FRC0402F4991TS
designator R?, comment 4.99K
RES 4.99kΩ ±1% 62.5mW 0402; Manufacturer: FOJAN; Mfr.Part #: FRC0402F4991TS; Package: 0402; LCSC Part #: C2933102
footprint RES-0402
pins: 1, 2

## FRC0402F5231TS
designator R?, comment 5.23K
5.23kΩ ±1% 62.5mW 0402 Thick Film Resistor; Manufacturer: FOJAN; Mfr.Part #: FRC0402F5231TS; Package: 0402; LCSC Part #: C2933105; DigiKey Part Number: NO; ComponentLink1Description: Link; ComponentLink1URL: https://www.lcsc.com/product-detail/C2933105.html; ComponentLink2Description: Link 1
footprint RES-0402
pins: 1, 2

## FRC0402F6201TS
designator R?, comment 6.2K
RES 6.2kΩ ±1% 62.5mW 0402; Manufacturer: FOJAN; Mfr.Part #: FRC0402F6201TS; Package: 0402; LCSC Part #: C2909371
footprint RES-0402
pins: 1, 2

## FRC0402F6202TS
designator R?, comment 62K
RES 62kΩ ±1% 62.5mW 0402; Manufacturer: FOJAN; Mfr.Part #: FRC0402F6202TS; Package: 0402; LCSC Part #: C2909375
footprint RES-0402
pins: 1, 2

## FRC0402F6203TS
designator R?, comment 620K
RES 620kΩ ±1% 62.5mW 0402; Manufacturer: FOJAN; Mfr.Part #: FRC0402F6203TS; Package: 0402; LCSC Part #: C2909373
footprint RES-0402
pins: 1, 2

## FRC0402F6803TS
designator R?, comment 680K
RES 680kΩ ±1% 62.5mW 0402; Manufacturer: FOJAN; Mfr.Part #: FRC0402F6803TS; Package: 0402; LCSC Part #: C2909377
footprint RES-0402
pins: 1, 2

## FRC0402F7500TS
designator R?, comment 750R
RES 750Ω ±1% 62.5mW 0402; Manufacturer: FOJAN; Mfr.Part #: FRC0402F7500TS; Package: 0402; LCSC Part #: C2909382
footprint RES-0402
pins: 1, 2

## FRC0402F8872TS
designator R?, comment 88.7K
RES 88700Ω ±1% 0402; Manufacturer: YAGEO; Mfr.Part #: FRC0402F8872TS; Package: 0402; LCSC Part #: C19268614
footprint RES-0402
pins: 1, 2

## FRC0402F9103TS
designator R?, comment 910K
RES 910kΩ ±1% 62.5mW 0402; Manufacturer: FOJAN; Mfr.Part #: FRC0402F9103TS; Package: 0402; LCSC Part #: C2909391
footprint RES-0402
pins: 1, 2

## FRC0402F9311TS
designator R?, comment 9.31K
RES 9.31kΩ ±1% 62.5mW 0402; Manufacturer: FOJAN; Mfr.Part #: FRC0402F9311TS; Package: 0402; LCSC Part #: C7467418
footprint RES-0402
pins: 1, 2

## FRC0603F2R00TS
designator R?, comment 2R
2Ω ±1% 100mW 0603 Thick Film Resistor; Manufacturer: FOJAN; Mfr.Part #: FRC0603F2R00TS; Package: 0603; LCSC Part #: C2933191; DigiKey Part Number: NO; ComponentLink1Description: Link; ComponentLink1URL: https://www.lcsc.com/product-detail/C2933191.html?s_z=n_2R&spm=wm.ssy.bg.0.xh&lcsc_vid=QVhYA1deElkMBVEAQVVWVAECEVVXUAcCTgNYUQVSEVAxVlNRQ1JaVVBRT1heXjsOAxUeFF5JWBYZEEoKFBINSQcJGk4dAgUUFAk%3D; ComponentLink2Description: Link 1
footprint RES-0603
pins: 1, 2

## FRC0603F3R30TS
designator R?, comment 3.3R
3.3Ω ±1% 100mW 0603 Thick Film Resistor; Manufacturer: FOJAN; Mfr.Part #: FRC0603F3R30TS; Package: 0603; LCSC Part #: C2930016; DigiKey Part Number: NO; ComponentLink1Description: Link; ComponentLink1URL: https://www.lcsc.com/product-detail/C2930016.html?s_z=n_q_C2930016&globalKeyword=C2930016; ComponentLink2Description: Link 1
footprint RES-0603
pins: 1, 2

## FRC0603F49R9TS
designator R?, comment 49.9R
49.9Ω ±1% 100mW 0603 Thick Film Resistor; Manufacturer: FOJAN; Mfr.Part #: FRC0603F4992TS; Package: 0603; LCSC Part #: C2930110; DigiKey Part Number: NO; ComponentLink1Description: Link; ComponentLink1URL: https://www.lcsc.com/product-detail/C2930110.html?s_z=n_49.9; ComponentLink2Description: Link 1
footprint RES-0603
pins: 1, 2

## FRC0603F1000TS
designator R?, comment 100R
RES 100Ω ±1% 100mW 0603; Manufacturer: YAGEO; Mfr.Part #: FRC0603F1000TS; Package: 0603; LCSC Part #: C2906981
footprint RES-0603
pins: 1, 2

## FRC0603F1372TS
designator R?, comment 13.7K
RES 13.7kΩ ±1% 100mW 0603; Manufacturer: FOJAN; Mfr.Part #: FRC0603F1372TS; Package: 0603; LCSC Part #: C2930064
footprint RES-0603
pins: 1, 2

## FRC0603F1822TS
designator R?, comment 18.2K
18.2kΩ ±1% 100mW 0603 Thick Film Resistor; Manufacturer: FOJAN; Mfr.Part #: FRC0603F1822TS; Package: 0603; LCSC Part #: C2933164; DigiKey Part Number: NO; ComponentLink1Description: Link; ComponentLink1URL: https://www.lcsc.com/product-detail/C2933164.html?s_z=n_18.2K; ComponentLink2Description: Link 1
footprint RES-0603
pins: 1, 2

## FRC0603F2203TS
designator R?, comment 220K